# Altium footprint library PCB3.PcbLib: 18 footprints (part 1 of 2)
Each footprint in its own frame and in the unit in brackets; x right, y up, seen from the top. Pads: shape width x height; smd on the part's side, far side on the other; paste and mask are expansions set on the pad; w line width, h text height; cw(c..) or ccw(c..) is an arc to the next point about the centre after c.
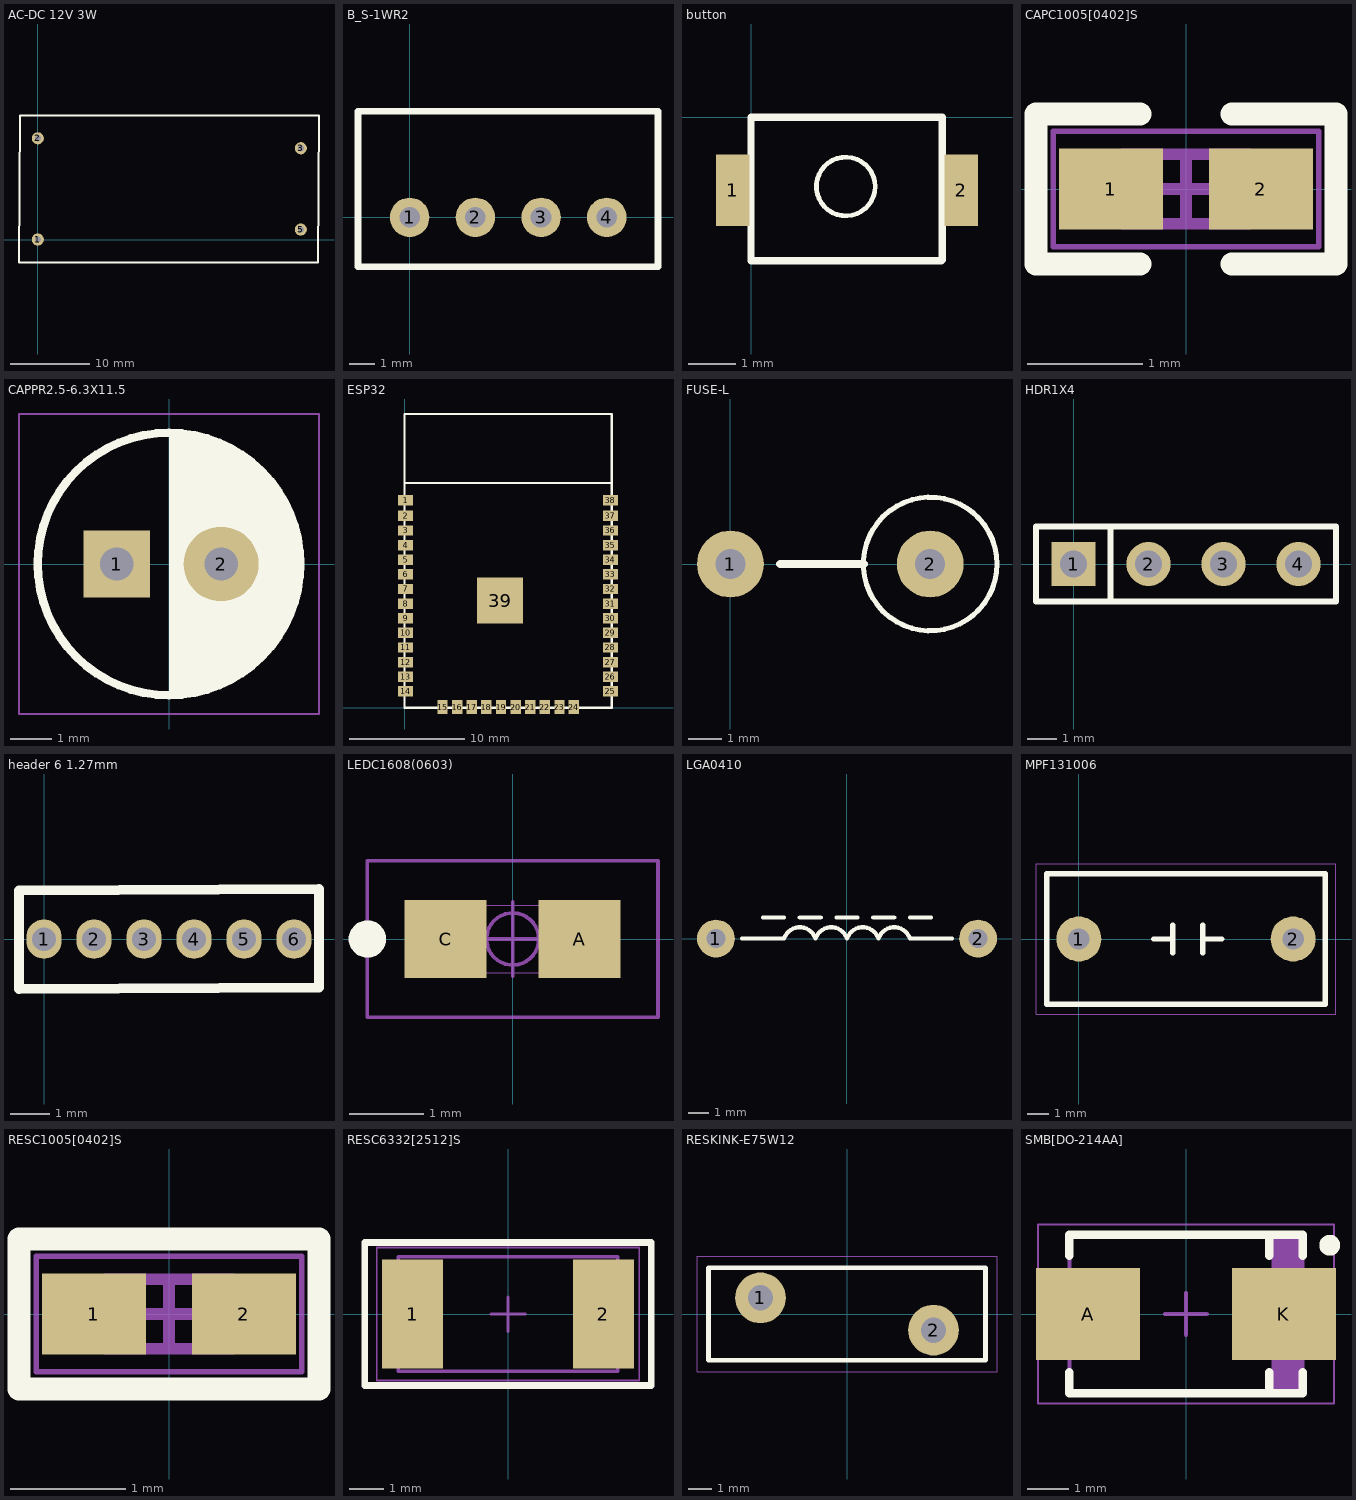
[diagram p0: the footprints below, top view; thin cyan lines are the x and y axes]

## AC-DC 12V 3W [mil] "GODSEND UA3"
pads (4):
  round 60 hole 30: 1(0,0) 2(0,500) 3(1299.21,450.79) 5(1299.21,49.21)
Top Overlay:
  lines w10: -93,-114 -87.53,613 1388.85,613 1383.38,-114 -93,-114
3D body: height 531.5, standoff -3.3, extent -91,-114 1385,614

## B_S-1WR2 [mil] "12v 3.3v dc 1w"
pads (4):
  round 60 hole 31.5: 1(0,0) 2(100,0) 3(200,0) 4(300,0)
Top Overlay:
  lines w10: -78.69,-75 -78.69,161.22 378,161.24 378,-74.99 -78.69,-75
3D body: height 400, standoff -3.3, extent -79,-75 377,161

## button [mm]
height 1.2
pads (2):
  rect 0.7x1.5 smd: 1(-0.381,-1.524) 2(4.394,-1.524)
Top Overlay:
  circle w0.1: c1.981,-1.448 r0.614
  lines w0.15: 0,-3 3.984,-3 4,-2.984 4,0 0,0 0,-3
3D body "SKRKAHE010.stp": height 2.1, standoff 0.1, extent -0.368,-2.951 4.432,-0.051

## CAPC1005[0402]S [mm] "Chip Capacitor,Silkscreen border, 2-Leads, Body 1.00x0.50mm, IPC Medium Density"
height 0.6
pads (2):
  rect 0.9x0.7 smd: 1(-0.65,0) 2(0.65,0)
Top Overlay:
  lines w0.2: -0.4,-0.65 -1.3,-0.65 -1.3,0.65 -0.4,0.65 ; 0.4,-0.65 1.3,-0.65 1.3,0.65 0.4,0.65
Mechanical 13:
  lines w0.1: -0.55,-0.3 -0.55,0.3 0.55,0.3 0.55,-0.3 -0.55,-0.3
Mechanical 15:
  lines w0.05: -1.15,-0.5 -1.15,0.5 1.15,0.5 1.15,-0.5 -1.15,-0.5
  lines w0.1: -0.3,0 0.3,0 ; 0,-0.3 0,0.3
3D body: height 0.6, standoff 0, extent -0.35,-0.3 0.35,0.3
3D body: height 0.6, standoff 0, extent -0.55,-0.3 -0.35,0.3
3D body: height 0.6, standoff 0, extent 0.35,-0.3 0.55,0.3

## CAPPR2.5-6.3X11.5 [mm]
pads (2):
  rect 1.6x1.6 hole 0.8: 1(-1.25,0)
  round 1.8 hole 0.8: 2(1.25,0)
Top Overlay:
  circle w0.2: c0,0 r3.15
  region: 0,-3.1 0.244,-3.1 0.726,-3.024 1.19,-2.873 1.625,-2.651 2.02,-2.365 2.365,-2.02 2.651,-1.625 2.873,-1.19 3.024,-0.726 3.1,-0.244 3.1,0.244 3.024,0.726 2.873,1.19 2.651,1.625 2.365,2.02 2.02,2.365 1.625,2.651 1.19,2.873 0.726,3.024 0.244,3.1 0,3.1
Mechanical 15:
  lines w0.05: -3.6,-3.6 3.6,-3.6 3.6,3.6 -3.6,3.6 -3.6,-3.6
3D body "CAPR-2.5-6.3-11.5.STEP": height 11.5, standoff -2, extent -3.15,-3.15 3.15,3.15

## ESP32 [mm]
height 1.2
pads (39):
  rect 1.3x0.9 smd: 1(0.102,18) 2(0.102,16.655) 3(0.102,15.385) 4(0.102,14.115) 5(0.102,12.845) 6(0.102,11.575) 7(0.102,10.305) 8(0.102,9.035) 9(0.102,7.765) 10(0.102,6.495) 11(0.102,5.225) 12(0.102,3.955) 13(0.102,2.685) 14(0.102,1.415) 25(17.873,1.415) 26(17.873,2.685) 27(17.873,3.955) 28(17.873,5.225) 29(17.873,6.495) 30(17.873,7.765) 31(17.873,9.035) 32(17.873,10.305) 33(17.873,11.575) 34(17.873,12.845) 35(17.873,14.115) 36(17.873,15.385) 37(17.873,16.655) 38(17.873,18)
  rect 0.9x1.2 smd: 15(3.3,0.045) 16(4.57,0.045) 17(5.84,0.045) 18(7.11,0.045) 19(8.38,0.045) 20(9.65,0.045) 21(10.92,0.045) 22(12.19,0.045) 23(13.46,0.045) 24(14.7,0.045)
  rect 4x4 smd: 39(8.3,9.3)
Top Overlay:
  lines w0.2: 0,19.5 18,19.5
  lines w0.203: 0,0 18,0 18,25.5 0,25.5 0,0
3D body "User Library-ESP321.STEP": height 2.91, standoff -0.01, extent 0.017,-0.05 18.017,25.45

## FUSE-L [mil]
height 511.81
pads (2):
  round 79 hole 35.43: 1(0,0) 2(236.22,0)
Top Overlay:
  circle w6: c236.22,0 r79
  lines w10: 59.06,0 157.48,0
3D body "保": height 545.06, standoff -77.66, extent -12.8,-74.21 313.9,83.27

## HDR1X4 [mm] "Connector; Header; 4 Position"
pads (4):
  rect 1.5x1.5 hole 0.9: 1(0,0)
  round 1.5 hole 0.9: 2(2.54,0) 3(5.08,0) 4(7.62,0)
Top Overlay:
  lines w0.2: 1.25,-1.25 1.25,1.25 ; -1.27,-1.27 8.89,-1.27 8.89,1.27 -1.27,1.27 -1.27,-1.27
3D body "1001-4.STEP": height 8.54, standoff -3, extent -1.27,-1.27 8.89,1.27

## header 6 1.27mm [mm]
pads (6):
  oval 0.9x1 hole 0.6: 1(0,0) 2(1.27,0) 3(2.54,0) 4(3.81,0) 5(5.08,0) 6(6.35,0)
Top Overlay:
  lines w0.254: -0.635,-1.261 -0.635,1.239 6.985,1.266 6.985,-1.234 -0.635,-1.261
3D body "pin_header_a-sl127-eg-g06d.stp": height 5.44, standoff -2.5, extent -0.635,-1.25 6.985,1.25

## LEDC1608(0603) [mm] "LED,Chip;1.60mm L X 0.80mm W X 0.80mm H"
height 0.8
pads (2):
  rect 1.1x1.05 smd: A(0.9,0) C(-0.9,0)
Top Overlay:
  circle w0.25: c-1.95,0 r0.125
Mechanical 15:
  circle w0.05: c0,0 r0.35
  lines w0.001: -0.9,-0.45 0.9,-0.45 0.9,0.45 -0.9,0.45 -0.9,-0.45
  lines w0.05: -0.5,0 0.5,0 ; 0,-0.5 0,0.5 ; -1.95,-1.05 1.95,-1.05 1.95,1.05 -1.95,1.05 -1.95,-1.05
3D body "LEDC0603.STEP": height 0.8, standoff 0, extent -0.9,-0.45 0.9,0.45

## LGA0410 [mm]
pads (2):
  round 1.8 hole 0.9: 1(-6.25,0) 2(6.25,0)
Top Overlay:
  lines w0.2: -5,0 -3,0 cw(c-2.25,-0.25) -1.5,0 cw(c-0.75,-0.25) 0,0 cw(c0.75,-0.25) 1.5,0 cw(c2.25,-0.25) 3,0 5,0 ; -4,1 -3,1 ; -2.25,1 -1.25,1 ; -0.5,1 0.5,1 ; 1.25,1 2.25,1 ; 3,1 4,1
3D body "LGA0410.STEP": height 3.85, standoff -2.3, extent -6.5,-2 6.5,2

## MPF131006 [mm] "Metallized Polypropylene Film Capacitor"
pads (2):
  round 2.1 hole 1: 1(0,0) 2(10,0)
Top Overlay:
  lines w0.254: 3.5,0 4.389,0 ; 4.389,-0.635 4.389,0.635 ; 5.786,-0.635 5.786,0.635 ; 5.786,0 6.675,0 ; -1.5,-3.048 11.5,-3.048 11.5,3.048 -1.5,3.048 -1.5,-3.048
Mechanical 15:
  lines w0.05: -2,-3.5 12,-3.5 12,3.5 -2,3.5 -2,-3.5
3D body: height 10, standoff 0, extent -1.627,-3.175 11.627,3.175

## RESC1005[0402]S [mm] "Silkscreen Outside, Chip Resistor, 2-Leads, Body 1.05x0.54mm, IPC Medium Density"
height 0.4
pads (2):
  rect 0.9x0.7 smd: 1(-0.65,0) 2(0.65,0)
Top Overlay:
  lines w0.2: -1.3,-0.65 -1.3,0.65 1.3,0.65 1.3,-0.65 -1.3,-0.65
Mechanical 13:
  lines w0.1: -0.55,-0.3 0.55,-0.3 0.55,0.3 -0.55,0.3 -0.55,-0.3
Mechanical 15:
  lines w0.05: -1.15,-0.5 1.15,-0.5 1.15,0.5 -1.15,0.5 -1.15,-0.5
  lines w0.1: -0.3,0 0.3,0 ; 0,-0.3 0,0.3
3D body "R0402.STEP": height 0.35, standoff 0, extent -0.5,-0.25 0.5,0.25

## RESC6332[2512]S [mm] "Silkscreen Outside, Chip Resistor, 2-Leads, Body 6.30x3.20mm, IPC Medium Density"
height 0.71
pads (2):
  rect 1.8x3.2 smd: 1(-2.8,0) 2(2.8,0)
Top Overlay:
  lines w0.2: -4.2,-2.1 -4.2,2.1 4.2,2.1 4.2,-2.1 -4.2,-2.1
Mechanical 13:
  lines w0.1: -3.225,-1.675 -3.225,1.675 3.225,1.675 3.225,-1.675 -3.225,-1.675
Mechanical 15:
  lines w0.05: -3.85,-1.95 -3.85,1.95 3.85,1.95 3.85,-1.95 -3.85,-1.95
  lines w0.1: -0.5,0 0.5,0 ; 0,-0.5 0,0.5
3D body: height 0.61, standoff 0, extent -2.625,-1.675 2.625,1.675
3D body: height 0.71, standoff 0, extent -3.225,-1.675 -2.625,1.675
3D body: height 0.71, standoff 0, extent 2.625,-1.675 3.225,1.675
3D body: height 0.71, standoff 0.61, extent -2.625,-1.675 2.625,1.675

## RESKINK-E75W12 [mm] "Kinked Leads, 7.5mm pitch, 12mm diameter"
height 14.5
pads (2):
  round 2.2 hole 1.1: 1(-3.75,0.7) 2(3.75,-0.7)
Top Overlay:
  lines w0.2: -6,-2 6,-2 6,2 -6,2 -6,-2
Mechanical 15:
  lines w0.05: -6.5,-2.5 6.5,-2.5 6.5,2.5 -6.5,2.5 -6.5,-2.5
3D body "KINKED-E75W12.STEP": height 15, standoff -2.6, extent -6,-2 6,2

## SMB[DO-214AA] [mm] "Molded Diode, 2-Leads, Body 5.30x3.55mm, IPC Medium Density"
height 2.4
pads (2):
  rect 2.5x2.2 smd: A(-2.35,0) K(2.35,0)
Top Overlay:
  circle w0.25: c3.45,1.65 r0.125
  lines w0.2: -2.8,-1.4 -2.8,-1.9 2.8,-1.9 2.8,-1.4 ; -2.8,1.4 -2.8,1.9 2.8,1.9 2.8,1.4 ; 2,-1.9 2,-1.4 ; 2,1.4 2,1.9
Mechanical 13:
  rectangle: 2.047,-1.9 2.8,1.9
  lines w0.1: -2.8,-1.9 2.8,-1.9 2.8,1.9 -2.8,1.9 -2.8,-1.9
Mechanical 15:
  lines w0.05: -3.55,-2.15 3.55,-2.15 3.55,2.15 -3.55,2.15 -3.55,-2.15
  lines w0.1: -0.5,0 0.5,0 ; 0,-0.5 0,0.5
3D body "DO-214AA.STEP": height -0.45, standoff -2.95, extent -2.8,-1.95 2.8,1.95